# Altium footprint library DipComponent.PcbLib: 303 footprints (part 10 of 19)
Each footprint in its own frame and in the unit in brackets; x right, y up, seen from the top. Pads: shape width x height; smd on the part's side, far side on the other; paste and mask are expansions set on the pad; w line width, h text height; cw(c..) or ccw(c..) is an arc to the next point about the centre after c.
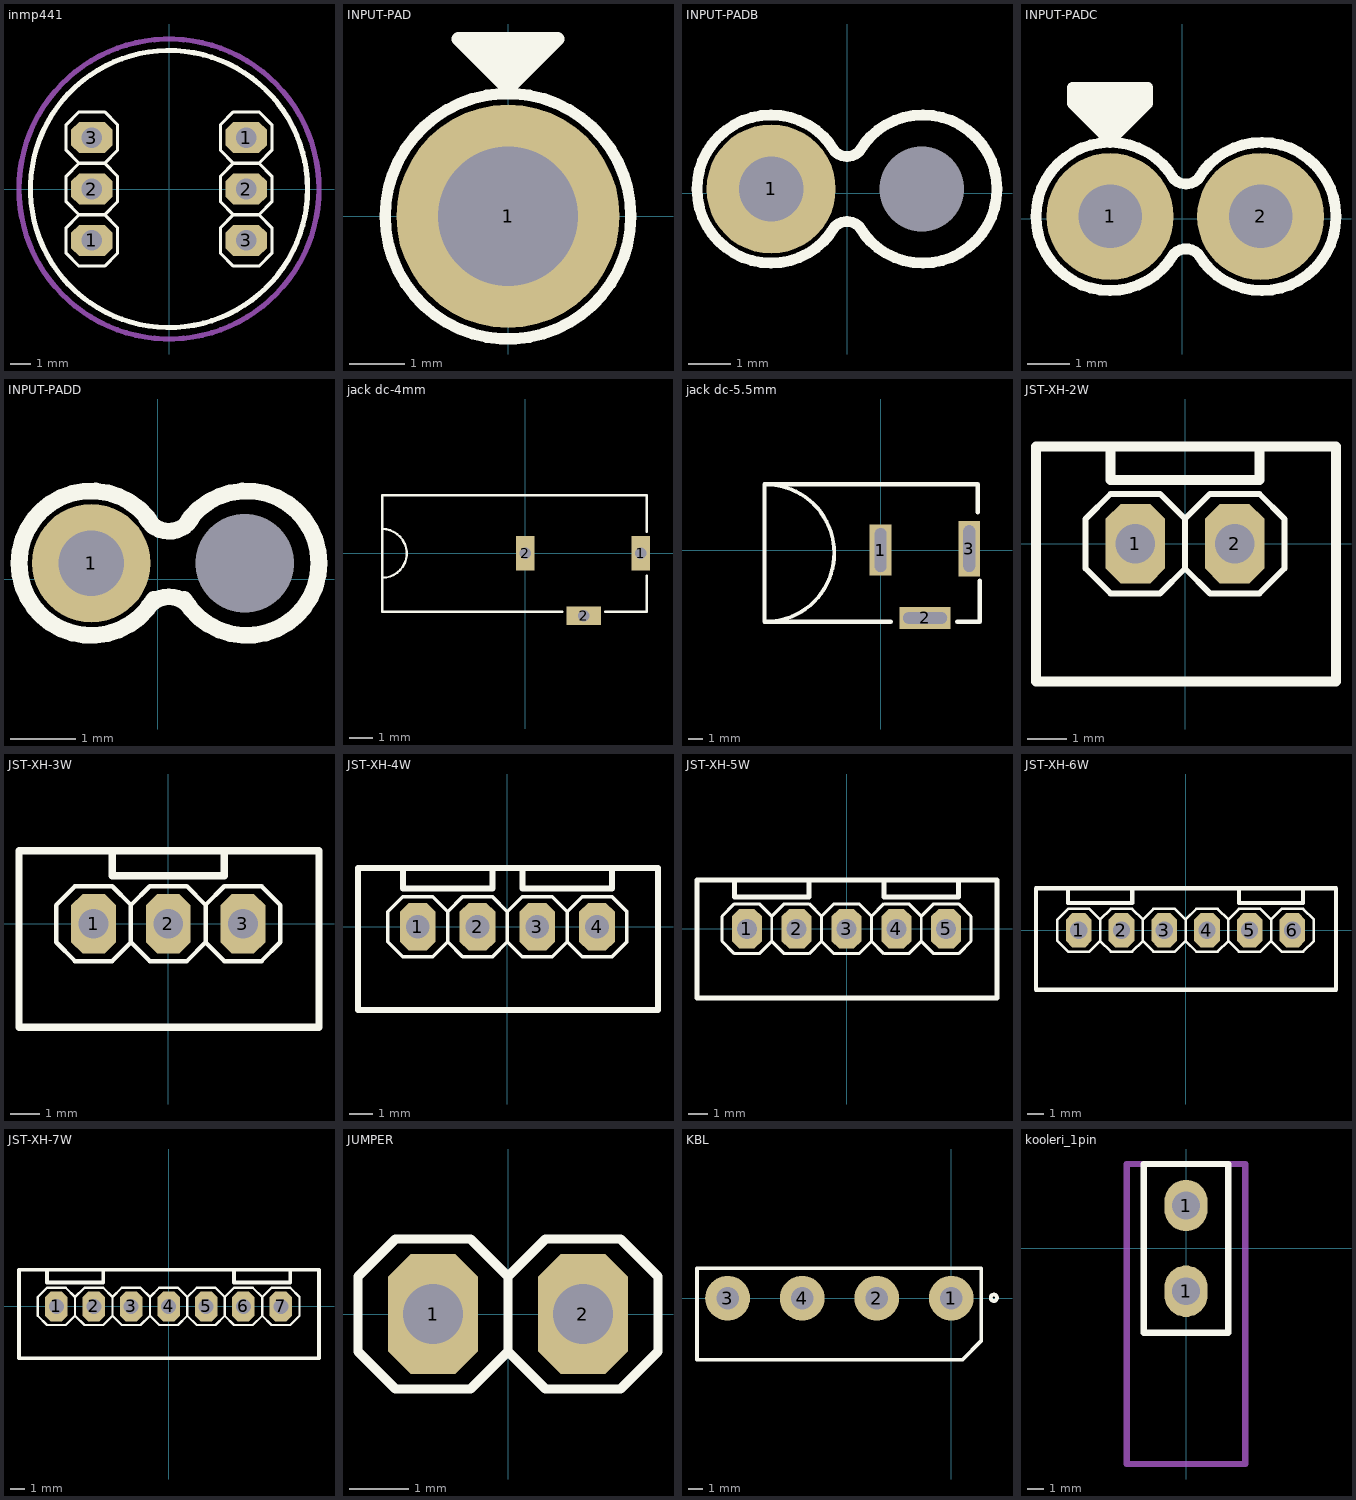
[diagram p9: the footprints below, top view; thin cyan lines are the x and y axes]

## inmp441 [mil]
pads (6):
  oct 80x60 hole 40: 1(-150,-100) 1(150,100) 2(-150,0) 2(150,0) 3(-150,100) 3(150,-100)
Top Overlay:
  circle w10: c0,0 r269.26
  region: 140,10 140,-10 160,-10 160,10
  region: 140,110 140,90 160,90 160,110
  region: 140,-90 140,-110 160,-110 160,-90
  region: -140,-10 -140,10 -160,10 -160,-10
  region: -140,-110 -140,-90 -160,-90 -160,-110
  region: -140,90 -140,110 -160,110 -160,90
  lines w6: -175,-50 -200,-75 -200,-125 -175,-150 -125,-150 -100,-125 -100,-75 -125,-50 ; -175,-50 -125,-50 ; -175,-50 -200,-25 -200,25 -175,50 ; -175,50 -125,50 ; -175,50 -200,75 -200,125 -175,150 -125,150 -100,125 -100,75 -125,50 ; -125,-50 -100,-25 -100,25 -125,50 ; 125,-50 175,-50 ; 125,-50 100,-25 100,25 125,50 ; 125,-50 100,-75 100,-125 125,-150 175,-150 200,-125 200,-75 175,-50 ; 125,50 175,50 ; 125,50 100,75 100,125 125,150 175,150 200,125 200,75 175,50 ; 175,-50 200,-25 200,25 175,50
Mechanical 3:
  circle w10: c0,0 r291.55
3D body "PinHeader 1X3.step": height 335.04, standoff -144.88, extent 88.98,-148.03 203.94,151.97
3D body "PinHeader 1X3.step": height 335.04, standoff -144.88, extent -203.94,-151.97 -88.98,148.03

## INPUT-PAD [mm]
pads (1):
  round 4 hole 2.5: 1(0,0)
Top Overlay:
  circle w0.203: c0,0 r2.2
  rectangle: -0.381,2.667 0.381,3.175
  lines w0.254: -0.635,3.175 0,2.54 0.635,3.175 ; -0.889,3.175 0,2.286 0.889,3.175 -0.889,3.175

## INPUT-PADB [mil]
pads (2):
  round 120 hole 60: 1(-70.81,3.75)
  round 0 hole 78.74 unplated: HOLE(69.19,3.75)
Top Overlay:
  lines w10: -139.71,3.75 ccw(c-70.81,3.75) -11.3,-30.97 cw(c-0.26,-42.01) 10.78,-30.97 ccw(c70.29,3.75) 139.19,3.75 ccw(c70.29,3.75) 10.78,38.46 cw(c-0.26,49.5) -11.3,38.46 ccw(c-70.81,3.75) -139.71,3.75

## INPUT-PADC [mm]
pads (2):
  round 3 hole 1.5: 1(-1.702,0.051) 2(1.854,0.051)
Top Overlay:
  lines w0.254: -1.702,2.083 -0.94,2.845 -0.94,2.972 -2.464,2.972 -2.464,2.845 -1.829,2.21 -1.829,2.591 -1.448,2.591 ; -1.702,3.099 -1.702,1.829 ; -2.591,2.718 -0.813,2.718 ; -2.591,2.718 -2.591,3.099 -0.813,3.099 -0.813,2.718 ; -2.591,2.718 -1.702,1.829 ; -1.702,1.829 -0.813,2.718 ; -3.452,0.051 cw(c-1.702,0.051) -0.19,0.933 ccw(c0.09,1.213) 0.371,0.933 cw(c1.882,0.051) 3.632,0.051 cw(c1.882,0.051) 0.371,-0.831 ccw(c0.09,-1.111) -0.19,-0.831 cw(c-1.702,0.051) -3.452,0.051 ; -2.337,2.845 -1.702,2.21 -1.067,2.845 -2.337,2.845

## INPUT-PADD [mm]
pads (2):
  round 1.8 hole 1: 1(-1.011,0.248)
  round 0 hole 1.5 unplated: HOLE(1.326,0.248)
Top Overlay:
  lines w0.254: -0.2,0.992 ccw(c0.171,1.13) 0.532,0.966 ; -0.171,-0.461 cw(c0.171,-0.661) 0.511,-0.456 ; -0.061,-0.307 cw(c-1.011,0.248) -2.111,0.248 cw(c-1.011,0.248) -0.061,0.802 ; 0.403,-0.307 ccw(c1.354,0.248) 2.454,0.248 ccw(c1.354,0.248) 0.403,0.802

## jack dc-4mm [mm]
pads (3):
  rect 0.8x1.5 hole 0.5 square: 1(5.004,0) 2(0,0)
  rect 1.5x0.8 hole 0.5 square: 2(2.54,-2.692)
Top Overlay:
  lines w0.1: -6.188,-1.055 ccw(c-6.188,0) -6.188,1.055 ; 1.61,-2.531 -6.188,-2.531 -6.188,2.524 5.268,2.524 5.268,0.924 ; 3.464,-2.531 5.268,-2.531 5.268,-0.956
3D body "pj-007.stp": height 7.5, standoff -3.1, extent -6.182,-2.835 5.268,2.515

## jack dc-5.5mm [mm]
pads (3):
  rect 1.5x3.5 hole 0.8 slot 3 at 90 deg: 1(0,0)
  rect 3.5x1.5 hole 0.8 slot 3 at 0 deg: 2(3.048,-4.648)
  rect 1.5x3.8 hole 0.8 slot 3.2 at 90 deg: 3(6.071,0.102)
Top Overlay:
  lines w0.254: -7.95,4.496 cw(c-7.874,-0.203) -7.905,-4.903
  lines w0.305: 0.686,-4.902 -7.95,-4.902 -7.95,4.496 6.655,4.496 6.655,2.591 ; 5.258,-4.902 6.782,-4.902 6.782,-2.108
3D body "User Library-PJ-002AH.STEP": height 11.05, standoff -3.45, extent -7.657,-4.826 6.743,4.574

## JST-XH-2W [mil]
pads (2):
  oct 60x80 hole 40: 1(-50,0) 2(50,0)
Top Overlay:
  lines w6: 0,-25 -25,-50 -75,-50 -100,-25 -100,25 -75,50 -25,50 0,25 ; 0,-25 0,25 ; 0,-25 25,-50 75,-50 100,-25 100,25 75,50 25,50 0,25
  lines w10: -75,98 -75,64 75,64 75,98 ; -150,-139 152,-139 152,98 -150,98 -150,-139
3D body "jst-2W.step": height 277.59, standoff -131.86, extent -144.67,-133 146.67,93.38

## JST-XH-3W [mil]
pads (3):
  oct 60x80 hole 40: 1(-100,0) 2(0,0) 3(100,0)
Top Overlay:
  lines w6: -50,-25 -25,-50 25,-50 50,-25 ; -50,-25 -50,25 ; -50,-25 -75,-50 -125,-50 -150,-25 -150,25 -125,50 -75,50 -50,25 ; -50,25 -25,50 25,50 50,25 ; 50,-25 50,25 ; 50,-25 75,-50 125,-50 150,-25 150,25 125,50 75,50 50,25
  lines w10: -75,98 -75,64 75,64 75,98 ; -200,-139 -200,98 202,98 202,-139 -200,-139
3D body "jst-3W.step": height 280.59, standoff -128.86, extent -194.88,-133.38 194.88,93

## JST-XH-4W [mil]
pads (4):
  oct 60x80 hole 40: 1(-150,0) 2(-50,0) 3(50,0) 4(150,0)
Top Overlay:
  lines w6: -100,-25 -75,-50 -25,-50 0,-25 ; -100,-25 -100,25 ; -100,-25 -125,-50 -175,-50 -200,-25 -200,25 -175,50 -125,50 -100,25 ; -100,25 -75,50 -25,50 0,25 ; 0,-25 25,-50 75,-50 100,-25 ; 0,-25 0,25 ; 0,25 25,50 75,50 100,25 ; 100,-25 125,-50 175,-50 200,-25 200,25 175,50 125,50 100,25 ; 100,-25 100,25
  lines w10: -175,98 -175,64 -25,64 -25,98 ; 25,98 25,64 175,64 175,98 ; -250,-139 -250,98 252,98 252,-139 -250,-139
3D body "jst-4W.step": height 283.59, standoff -125.86, extent -244.11,-135.2 244.09,91.18

## JST-XH-5W [mil]
pads (5):
  oct 60x80 hole 40: 1(-200,0) 2(-100,0) 3(0,0) 4(100,0) 5(200,0)
Top Overlay:
  lines w6: -150,-25 -175,-50 -225,-50 -250,-25 -250,25 -225,50 -175,50 -150,25 ; -150,-25 -150,25 ; -150,-25 -125,-50 -75,-50 -50,-25 ; -150,25 -125,50 -75,50 -50,25 ; -50,-25 -50,25 ; -50,-25 -25,-50 25,-50 50,-25 ; -50,25 -25,50 25,50 50,25 ; 50,-25 50,25 ; 50,-25 75,-50 125,-50 150,-25 ; 50,25 75,50 125,50 150,25 ; 150,-25 150,25 ; 150,-25 175,-50 225,-50 250,-25 250,25 225,50 175,50 150,25
  lines w10: -225,98 -225,64 -75,64 -75,98 ; 75,98 75,64 225,64 225,98 ; -300,-139 302,-139 302,98 -300,98 -300,-139
3D body "jst-5W.step": height 283.59, standoff -125.86, extent -293.32,-134.2 293.3,92.19

## JST-XH-6W [mil]
pads (6):
  oct 60x80 hole 40: 1(-250,0) 2(-150,0) 3(-50,0) 4(50,0) 5(150,0) 6(250,0)
Top Overlay:
  lines w6: -200,-25 -175,-50 -125,-50 -100,-25 ; -200,-25 -200,25 ; -200,-25 -225,-50 -275,-50 -300,-25 -300,25 -275,50 -225,50 -200,25 ; -200,25 -175,50 -125,50 -100,25 ; -100,-25 -75,-50 -25,-50 0,-25 ; -100,-25 -100,25 ; -100,25 -75,50 -25,50 0,25 ; 0,-25 25,-50 75,-50 100,-25 ; 0,-25 0,25 ; 0,25 25,50 75,50 100,25 ; 100,-25 125,-50 175,-50 200,-25 ; 100,-25 100,25 ; 100,25 125,50 175,50 200,25 ; 200,-25 225,-50 275,-50 300,-25 300,25 275,50 225,50 200,25 ; 200,-25 200,25
  lines w10: -275,98 -275,64 -125,64 -125,98 ; 125,98 125,64 275,64 275,98 ; -350,-139 -350,98 352,98 352,-139 -350,-139
3D body "jst-6W.step": height 280.59, standoff -128.86, extent -342.53,-134.2 342.51,92.19

## JST-XH-7W [mil]
pads (7):
  oct 60x80 hole 40: 1(-300,0) 2(-200,0) 3(-100,0) 4(0,0) 5(100,0) 6(200,0) 7(300,0)
Top Overlay:
  lines w6: -250,-25 -275,-50 -325,-50 -350,-25 -350,25 -325,50 -275,50 -250,25 ; -250,-25 -250,25 ; -250,-25 -225,-50 -175,-50 -150,-25 ; -250,25 -225,50 -175,50 -150,25 ; -150,-25 -125,-50 -75,-50 -50,-25 ; -150,-25 -150,25 ; -150,25 -125,50 -75,50 -50,25 ; -50,-25 -25,-50 25,-50 50,-25 ; -50,-25 -50,25 ; -50,25 -25,50 25,50 50,25 ; 50,-25 75,-50 125,-50 150,-25 ; 50,-25 50,25 ; 50,25 75,50 125,50 150,25 ; 150,-25 175,-50 225,-50 250,-25 ; 150,-25 150,25 ; 150,25 175,50 225,50 250,25 ; 250,-25 275,-50 325,-50 350,-25 350,25 325,50 275,50 250,25 ; 250,-25 250,25
  lines w10: -325,98 -325,64 -175,64 -175,98 ; 175,98 175,64 325,64 325,98 ; -400,-139 402,-139 402,98 -400,98 -400,-139
3D body "jst-7W.step": height 280.59, standoff -128.86, extent -391.73,-133.86 391.73,92.52

## JUMPER [mil]
pads (2):
  oct 60x80 hole 40: 1(-50,0) 2(50,0)
Top Overlay:
  rectangle: 40,-10 60,10
  rectangle: -60,-10 -40,10
  lines w6: 0,-25 0,25 ; 0,-25 -25,-50 -75,-50 -100,-25 -100,25 -75,50 -25,50 0,25 ; 0,-25 25,-50 75,-50 100,-25 100,25 75,50 25,50 0,25
3D body "SW3dPS-Jumper SL2.STEP": height 374.02, standoff -102.36, extent -98.43,-48.82 98.43,51.18

## KBL [mil]
pads (4):
  round 120 hole 60: 1(0,0) 2(-200,0) 3(-600,0) 4(-400,0)
Top Overlay:
  circle w10: c114,1 r8.54
  lines w10: -682,-165 30,-165 80,-115 80,80 -682,80 -682,-165
3D body "User Library-Silicon Bridge Rectifiers KBL04.step": height 677.17, standoff -992.13, extent -675.01,-158 73.02,72.31

## kooleri_1pin [mil] "dip"
pads (2):
  oval 100x120 hole 65: 1(0,-100) 1(0,100)
Top Overlay:
  lines w15: -98.43,-196.85 98.43,-196.85 98.43,196.85 -98.43,196.85 -98.43,-196.85
Mechanical 15:
  lines w15: -137.8,-503 137.8,-503 137.8,196.85 -137.8,196.85 -137.8,-503
3D body "koleri.STEP": height 354.33, standoff -78.74, extent -13,-501.84 18.5,143.84